# Altium schematic symbol library BARKO_SCHLIB.SchLib: 1064 symbols (part 9 of 11) (continued)
## R-1K8-0603 (continued)
RES SMD 1.8K OHM 5% 1/10W 0603; Manufacturer: Yageo; Manufacturer Part Number: RC0603JR-071K8L; Resistance: 1.8kR; Temperature Coefficient: 100ppm/°C; Voltage Rating (DC): 50V; Power Rating: 100mW; Working Voltage: 75V; .PCBCHK: USED; .Creator: F:TALI; Washability: OK; Stock 1: 1678078; Pricing 1: 1=0.1, 10=0.022, 100=0.0088, 1000=0.00396, 2500=0.00344 (USD); Number of Pins: 2; Case Code (Metric): 1608; Case Code (Imperial): 0603; Min Operating Temperature: -55°C; Max Operating Temperature: 155°C; Tolerance: 5%; Composition: Thick Film; Packaging: Tape and Reel; Package Quantity: 1; Voltage Rating: 50V; Number of Terminations: 2; Termination: SMD/SMT; Military Standard: Not; Max Power Dissipation: 100mW; Features: Moisture Resistant; Length: 1.6mm; Height: 0.022inch; Width: 0.8mm; Depth: 0.8mm; REACH SVHC: No SVHC; Lead Free: Lead Free; ComponentLink1URL: http://www.yageo.com.tw/exep/pages/download/literatures/PYu-R_INT-thick_7.pdf; ComponentLink1Description: http://www.yageo.com.tw/exep/pages/download/literatures/PYu-R_INT-thick_7.pdf; ComponentLink2URL: http://www.yageo.com/documents/recent/PYu-RC_Group_51_RoHS_L_9.pdf; ComponentLink2Description: http://www.yageo.com/documents/recent/PYu-RC_Group_51_RoHS_L_9.pdf; ComponentLink3URL: http://www.mouser.com/catalog/specsheets/RC0603.pdf; ComponentLink3Description: http://www.mouser.com/catalog/specsheets/RC0603.pdf; ComponentLink4URL: http://www.farnell.com/datasheets/443971.pdf; ComponentLink4Description: http://www.farnell.com/datasheets/443971.pdf; ComponentLink5URL: https://www.verical.com/server-webapp/html/getDatasheet?partID=327961; ComponentLink5Description: https://www.verical.com/server-webapp/html/getDatasheet?partID=327961; Stock 2: 124162; Pricing 2: 1=0.1, 10=0.016, 100=0.0064, 1000=0.00289, 2500=0.0025 (USD); Mount: Surface Mount; Contact Plating: Matte,Tin; Radiation Hardening: No; ComponentLink6URL: http://components.arrow.com/part/dataview/40961995S7458778N1174; ComponentLink6Description: http://components.arrow.com/part/dataview/40961995S7458778N1174; Stock 3: 13326; Pricing 3: 1=0.1, 10=0.034, 100=0.0138, 1000=0.00618, 2500=0.00536 (USD); Weight: 7.1E-05oz; ComponentLink7URL: http://www.mouser.com/ds/2/427/dcrcwe3-109170.pdf; ComponentLink7Description: http://www.mouser.com/ds/2/427/dcrcwe3-109170.pdf; ComponentLink8URL: http://www.vishay.com/docs/20035/dcrcwe3.pdf; ComponentLink8Description: http://www.vishay.com/docs/20035/dcrcwe3.pdf; .SCHCHK: USED; Supplier 1: Digi-Key; Supplier Part Number 1: RMCF0603JT1K80CT-ND
footprint R-0603
pins: 1, 2

## R-1K37-0402
designator R?, comment 1K37  Case Code (Imperial): 0402
RES SMD 1.37K OHM 1% 1/10W 0402; Manufacturer: Panasonic; Manufacturer Part Number: ERJ-2RKF1371X; Voltage Rating: 50V; Resistance: 1.37kR; Power Rating: 100mW; Temperature Coefficient: 100ppm/°C; .PCBCHK: USED; .Creator: F:TALI; Washability: OK; Stock 1: 237151; Pricing 1: 1=0.1, 10=0.045, 100=0.0183, 1000=0.00823, 2500=0.00715, 5000=0.0059 (USD); Mount: Surface Mount; Case/Package: 0402; Case Code (Metric): 1005; Contact Plating: Tin; Min Operating Temperature: -55°C; Max Operating Temperature: 155°C; Packaging: Tape and Reel; Tolerance: 1%; Package Quantity: 10000; Termination: SMD/SMT; Composition: Thick Film; Number of Terminations: 2; Military Standard: Not; Max Power Dissipation: 100mW; Voltage Rating (DC): 50V; Length: 1mm; Height: 0.35mm; Width: 0.5mm; Depth: 0.5mm; Radiation Hardening: No; REACH SVHC: No SVHC; Lead Free: Lead Free; ComponentLink1URL: http://www.farnell.com/datasheets/1678782.pdf; ComponentLink1Description: http://www.farnell.com/datasheets/1678782.pdf; ComponentLink2URL: https://www.alliedelec.com/m/d/623f45ff1957d936ff56d46fd1c28cac.pdf; ComponentLink2Description: https://www.alliedelec.com/m/d/623f45ff1957d936ff56d46fd1c28cac.pdf; ComponentLink3URL: http://www.farnell.com/datasheets/1911175.pdf; ComponentLink3Description: http://www.farnell.com/datasheets/1911175.pdf; Stock 2: 9960; Pricing 2: 1=0.61, 10=0.464, 100=0.1952, 1000=0.10767, 2500=0.10094 (USD); .SCHCHK: USED; Supplier 1: Digi-Key; Supplier Part Number 1: P1.37KLDKR-ND
footprint R-0402
pins: 1, 2

## R-1K-0402
designator R?, comment 1K  Case Code (Imperial): 0402
RES SMD 1K OHM 1% 1/10W 0402; Manufacturer: Vishay Beyschlag; Manufacturer Part Number: MCS04020C1001FE000; Resistance: 1kR; Temperature Coefficient: 50ppm/°C; Power Rating: 63mW; Voltage Rating: 50V; Max Power Dissipation: 100mW; .PCBCHK: USED; .Creator: F:TALI; Washability: OK; Stock 1: 159823; Pricing 1: 1=0.3, 10=0.254, 100=0.0993, 1000=0.04158, 2500=0.03812, 5000=0.03465 (USD); Mount: Surface Mount; Case/Package: 0402; Weight: 2.1E-05oz; Contact Plating: Tin; Case Code (Metric): 1005; Min Operating Temperature: -55°C; Max Operating Temperature: 125°C; Tolerance: 1%; Composition: Thin Film; Package Quantity: 1; Packaging: Tape and Reel; Number of Terminations: 2; Termination: SMD/SMT; Military Standard: Not; Voltage Rating (DC): 50V; Length: 1mm; Height: 0.015inch; Width: 0.02inch; Depth: 0.5mm; Radiation Hardening: No; REACH SVHC: No SVHC; Lead Free: Lead Free; ComponentLink1URL: http://www.vishay.com/docs/28705/mcx0x0xpro.pdf; ComponentLink1Description: http://www.vishay.com/docs/28705/mcx0x0xpro.pdf; ComponentLink2URL: http://www.vishay.com/docs/28705/mc_pro.pdf; ComponentLink2Description: http://www.vishay.com/docs/28705/mc_pro.pdf; Number of Pins: 2; Features: Automotive AEC-Q200; ComponentLink3URL: http://industrial.panasonic.com/www-data/pdf/AOA0000/AOA0000CE2.pdf; ComponentLink3Description: http://industrial.panasonic.com/www-data/pdf/AOA0000/AOA0000CE2.pdf; ComponentLink4URL: https://industrial.panasonic.com/cdbs/www-data/pdf/RDA0000/DMA0000COL11.pdf; ComponentLink4Description: https://industrial.panasonic.com/cdbs/www-data/pdf/RDA0000/DMA0000COL11.pdf; ComponentLink5URL: http://www.farnell.com/datasheets/1678782.pdf; ComponentLink5Description: http://www.farnell.com/datasheets/1678782.pdf; ComponentLink6URL: http://www.farnell.com/datasheets/1911175.pdf; ComponentLink6Description: http://www.farnell.com/datasheets/1911175.pdf; ComponentLink7URL: http://www.jameco.com/Jameco/Products/ProdDS/1987020.pdf; ComponentLink7Description: http://www.jameco.com/Jameco/Products/ProdDS/1987020.pdf; ComponentLink8URL: http://www.alliedelec.com/m/d/623f45ff1957d936ff56d46fd1c28cac.pdf; ComponentLink8Description: http://www.alliedelec.com/m/d/623f45ff1957d936ff56d46fd1c28cac.pdf; Working Voltage: 50V; ComponentLink9URL: https://industrial.panasonic.com/cdbs/www-data/pdf/RDA0000/AOA0000C301.pdf; ComponentLink9Description: https://industrial.panasonic.com/cdbs/www-data/pdf/RDA0000/AOA0000C301.pdf; ComponentLink10URL: http://www.jameco.com/Jameco/Products/ProdDS/1986781.pdf; ComponentLink10Description: http://www.jameco.com/Jameco/Products/ProdDS/1986781.pdf; ComponentLink11URL: http://www.farnell.com/datasheets/2059623.pdf; ComponentLink11Description: http://www.farnell.com/datasheets/2059623.pdf; ComponentLink12URL: http://industrial.panasonic.com/www-data/pdf/AOA0000/AOA0000CE1.pdf; ComponentLink12Description: http://industrial.panasonic.com/www-data/pdf/AOA0000/AOA0000CE1.pdf; ComponentLink13URL: http://www.alliedelec.com/m/d/51cd0790071e1666bdb9d00c57fcf960.pdf; ComponentLink13Description: http://www.alliedelec.com/m/d/51cd0790071e1666bdb9d00c57fcf960.pdf; ComponentLink14URL: http://www.farnell.com/datasheets/1500035.pdf; ComponentLink14Description: http://www.farnell.com/datasheets/1500035.pdf; Stock 2: 17028178; Pricing 2: 1=0.1, 10=0.054, 100=0.022, 1000=0.00988, 2500=0.00858, 5000=0.00709 (USD); ComponentLink15URL: https://industrial.panasonic.com/cdbs/www-data/pdf/RDA0000/AOA0000C304.pdf; ComponentLink15Description: https://industrial.panasonic.com/cdbs/www-data/pdf/RDA0000/AOA0000C304.pdf; .SCHCHK: USED; Supplier 1: Digi-Key; Supplier Part Number 1: P1.00KLDKR-ND
footprint R-0402
pins: 1, 2

## R-1K-0603
designator R?, comment 1K  Case Code (Imperial): 0603
RES SMD 1K OHM 5% 1/10W 0603; Manufacturer: Yageo; Manufacturer Part Number: RC0603JR-071KL; Resistance: 1kR; Temperature Coefficient: 100ppm/°C; Voltage Rating (DC): 50V; Power Rating: 100mW; .PCBCHK: USED; .Creator: F:TALI; Washability: OK; Supplier 1: Digi-Key; Supplier Part Number 1: 311-1.0KGRCT-ND; Stock 1: 16415399; Pricing 1: 1=0.09, 10=0.019, 100=0.0077, 1000=0.00346, 2500=0.00301 (EUR); Case/Package: 0603; Number of Pins: 2; Contact Plating: Matte,Tin; Case Code (Metric): 1608; Min Operating Temperature: -55°C; Max Operating Temperature: 155°C; Tolerance: 5%; Composition: Thick Film; Packaging: Tape and Reel; Package Quantity: 5000; Voltage Rating: 50V; Termination: SMD/SMT; Military Standard: Not; Length: 1.6mm; Height: 0.45mm; Width: 0.8mm; Depth: 0.8mm; Radiation Hardening: No; REACH SVHC: Unknown; Lead Free: Lead Free; ComponentLink1URL: http://www.yageo.com/documents/recent/PYu-RC_Group_51_RoHS_L_2.pdf; ComponentLink1Description: http://www.yageo.com/documents/recent/PYu-RC_Group_51_RoHS_L_2.pdf; ComponentLink2URL: http://www.farnell.com/datasheets/443971.pdf; ComponentLink2Description: http://www.farnell.com/datasheets/443971.pdf; Supplier 2: Digi-Key; Supplier Part Number 2: YAG1311CT-ND; Stock 2: 9; Pricing 2: 1=0.1, 10=0.044, 100=0.0178, 1000=0.00798, 2500=0.00693 (USD); Number of Terminations: 2; Max Power Dissipation: 100mW; Features: Moisture Resistant; Supplier Part Number 3: SMD0603-1K; Stock 3: 0; Pricing 3: 100=0.0125, 1000=0.0035, 5000=0.002, 15000=0.00165, 50000=0.0014 (USD); Supplier 3: Ozdisan; .SCHCHK: USED
footprint R-0603
pins: 1, 2

## R-1K-0603-0.1%
designator R?, comment 1K  Case/Package: 0603  Tolerance: 0.1%
RES SMD 1K OHM 0.1% 1/5W 0603; Manufacturer: Panasonic; Manufacturer Part Number: ERJ-PB3B1001V; Resistance: 1kR; Max Power Dissipation: 200mW; Temperature Coefficient: 50ppm/°C; Supplier 1: Digi-Key; Supplier Part Number 1: P19972CT-ND; Stock: 32907; Pricing: 1=0.23, 10=0.191, 25=0.1392, 50=0.101, 100=0.0748, 250=0.0574, 500=0.0452, 1000=0.0313 (USD); RoHS: Yes; Case Code (Metric): 1608; Case Code (Imperial): 0603; Min Operating Temperature: -55°C; Max Operating Temperature: 155°C; Packaging: Tape and Reel; Resistor Type: Thick Film; Features: Automotive AEC-Q200; Number of Terminations: 2; Length: 0.063inch; Width: 0.032inch; Height - Seated (Max): 0.022inch; ComponentLink1URL: http://www.farnell.com/datasheets/2286937.pdf?src-supplier=Newark; ComponentLink1Description: http://www.farnell.com/datasheets/2286937.pdf?src-supplier=Newark; ComponentLink2URL: https://industrial.panasonic.com/cdbs/www-data/pdf/RDM0000/DMM0000COL5.pdf?src-supplier=Digi-Key; ComponentLink2Description: https://industrial.panasonic.com/cdbs/www-data/pdf/RDM0000/DMM0000COL5.pdf?src-supplier=Digi-Key; ComponentLink3URL: https://industrial.panasonic.com/sa/system/files/data/download/catalog/id_fixed-resistors_e_2.pdf?src-supplier=Digi-Key; ComponentLink3Description: https://industrial.panasonic.com/sa/system/files/data/download/catalog/id_fixed-resistors_e_2.pdf?src-supplier=Digi-Key
footprint R-0603
pins: 1, 2

## R-1K-0805
designator R?, comment 1K  Case Code (Imperial): 0805
RES SMD 1K OHM 1% 1/8W 0805; Manufacturer: Yageo; Manufacturer Part Number: RC0805FR-071KL; Resistance: 1kR; Temperature Coefficient: 100ppm/°C; Voltage Rating (DC): 150V; Power Rating: 125mW; .PCBCHK: USED; .Creator: F:TALI; Washability: OK; Stock 1: 19295000; Pricing 1: 5000=0.00544, 10000=0.00473, 25000=0.00415, 50000=0.00381, 125000=0.00373 (USD); Case/Package: 0805; Number of Pins: 2; Case Code (Metric): 2012; Min Operating Temperature: -55°C; Max Operating Temperature: 155°C; Tolerance: 1%; Packaging: Tape and Reel; Composition: Thick Film; Package Quantity: 1; Voltage Rating: 150V; Number of Terminations: 2; Termination: SMD/SMT; Military Standard: Not; Max Power Dissipation: 125mW; Features: Moisture Resistant; Length: 0.079inch; Height: 0.024inch; Width: 0.049inch; Depth: 1.25mm; REACH SVHC: Unknown; Lead Free: Lead Free; ComponentLink1URL: http://www.yageo.com/documents/recent/PYu-RC_Group_51_RoHS_L_9.pdf; ComponentLink1Description: http://www.yageo.com/documents/recent/PYu-RC_Group_51_RoHS_L_9.pdf; ComponentLink2URL: http://documents.rs-components.com/techlib://itc_doclist_GB.htm?stockno=6183583; ComponentLink2Description: http://documents.rs-components.com/techlib://itc_doclist_GB.htm?stockno=6183583; ComponentLink3URL: http://www.farnell.com/datasheets/1686128.pdf; ComponentLink3Description: http://www.farnell.com/datasheets/1686128.pdf; ComponentLink4URL: http://www.yageo.ru/pdf/RC0805.pdf; ComponentLink4Description: http://www.yageo.ru/pdf/RC0805.pdf; ComponentLink5URL: http://www.farnell.com/datasheets/444164.pdf; ComponentLink5Description: http://www.farnell.com/datasheets/444164.pdf; Stock 2: 249237; Pricing 2: 1=0.1, 10=0.039, 100=0.0159, 1000=0.00716, 2500=0.00622 (USD); Contact Plating: Lead,Matte,Tin; Radiation Hardening: No; ComponentLink6URL: http://www.farnell.com/datasheets/2167052.pdf; ComponentLink6Description: http://www.farnell.com/datasheets/2167052.pdf; ComponentLink7URL: http://www.farnell.com/datasheets/442941.pdf; ComponentLink7Description: http://www.farnell.com/datasheets/442941.pdf; Stock 3: 229706; Pricing 3: 1=0.1, 10=0.031, 100=0.0124, 1000=0.00559, 2500=0.00485 (USD); .SCHCHK: USED; Supplier 1: Digi-Key; Supplier Part Number 1: 311-1.00KCRTR-ND
footprint R-0805
pins: 1, 2

## R-1K-1206
designator R?, comment 1K  Max Power Dissipation: 1/2W  Case Code (Imperial): 1206
RES SMD 1K 1/2W 5% 1206; Manufacturer: Stackpole Electronics; Manufacturer Part Number: RNCP1206FTD1K00; Resistance: 1kR; Tolerance: 1%; Temperature Coefficient: 100ppm/°C; .PCBCHK: USED; .Creator: F:TALI; Washability: OK; Stock 1: 605690; Pricing 1: 1=0.1, 10=0.093, 100=0.0358, 1000=0.01575, 2500=0.0136 (USD); Mount: Surface Mount; Case/Package: 1206; Case Code (Metric): 3216; Contact Plating: Matte,Tin; Min Operating Temperature: -55°C; Max Operating Temperature: 155°C; Packaging: Tape and Reel; Composition: Thin Film; Number of Terminations: 2; Features: Anti-Sulfur,Moisture Resistant; Length: 0.122inch; Height: 0.024inch; Width: 0.059inch; Radiation Hardening: No; Lead Free: Lead Free; Stock 2: 57471; Pricing 2: 1=0.16, 10=0.133, 100=0.052, 1000=0.02178, 2500=0.01996 (USD); Package Quantity: 1; ComponentLink1URL: http://www.rohm.com/web/global/datasheet/ESR01MZPF/esr-e; ComponentLink1Description: http://www.rohm.com/web/global/datasheet/ESR01MZPF/esr-e; ComponentLink2URL: https://www.rohm.com/datasheet/ESR01MZPF/esr-e; ComponentLink2Description: https://www.rohm.com/datasheet/ESR01MZPF/esr-e; Stock 3: 10000; Pricing 3: 1=0.15, 10=0.126, 100=0.0494, 1000=0.02069, 2500=0.01897 (USD); ComponentLink3URL: http://www.bourns.com/docs/Product-Datasheets/CRM0805_1206_2010.pdf; ComponentLink3Description: http://www.bourns.com/docs/Product-Datasheets/CRM0805_1206_2010.pdf; .SCHCHK: USED; Supplier 1: Digi-Key; Supplier Part Number 1: RNCP1206FTD1K00DKR-ND
footprint R-1206
pins: 1, 2

## R-1K-1206-0.1%
designator R?, comment 1K  Case/Package: 1206  Tolerance: 0.1%
RES SMD 1K OHM 0.1% 1/4W 1206; Manufacturer: Panasonic; Manufacturer Part Number: ERA8AEB102V; Resistance: 1kR; Temperature Coefficient: 25ppm/°C; Power Rating: 250mW; Voltage Rating: 150V; Supplier 1: Digi-Key; Supplier Part Number 1: P1.0KBCCT-ND; Stock: 1249; Pricing: 1=0.57, 10=0.411, 100=0.2135, 1000=0.1149, 2500=0.1117 (USD); RoHS: Yes; Mount: Surface Mount; Number of Pins: 2; Contact Plating: Tin; Case Code (Imperial): 1206; Case Code (Metric): 3216; Min Operating Temperature: -55°C; Max Operating Temperature: 155°C; Resistor Type: Metal Film,Thin Film; Packaging: Tape and Reel; Package Quantity: 5000; Number of Terminations: 2; Max Power Dissipation: 250mW; Voltage Rating (DC): 150V; Length: 3.2mm; Width: 1.6mm; Height: 0.6mm; Depth: 1.6mm; Radiation Hardening: No; REACH SVHC: No SVHC; Military Standard: Not; Lead Free: Lead Free; ComponentLink1URL: https://datasheet.ciiva.com/7942/1776116-7942422.pdf?src-supplier=Element14; ComponentLink1Description: https://datasheet.ciiva.com/7942/1776116-7942422.pdf?src-supplier=Element14; ComponentLink2URL: https://datasheet.ciiva.com/22783/1776116-22783814.pdf?src-supplier=Farnell; ComponentLink2Description: https://datasheet.ciiva.com/22783/1776116-22783814.pdf?src-supplier=Farnell; ComponentLink3URL: https://datasheet.ciiva.com/43455/1776116-43455846.pdf?src-supplier=Farnell; ComponentLink3Description: https://datasheet.ciiva.com/43455/1776116-43455846.pdf?src-supplier=Farnell; ComponentLink4URL: https://datasheet.ciiva.com/7942/1776116-7942423.pdf?src-supplier=Element14; ComponentLink4Description: https://datasheet.ciiva.com/7942/1776116-7942423.pdf?src-supplier=Element14; ComponentLink5URL: https://datasheet.ciiva.com/48425/era-eng-tds-48425687.pdf?src-supplier=Distrelec; ComponentLink5Description: https://datasheet.ciiva.com/48425/era-eng-tds-48425687.pdf?src-supplier=Distrelec; ComponentLink6URL: https://datasheet.ciiva.com/48529/era-eng-tds-48529623.pdf?src-supplier=Distrelec; ComponentLink6Description: https://datasheet.ciiva.com/48529/era-eng-tds-48529623.pdf?src-supplier=Distrelec; ComponentLink7URL: https://datasheet.ciiva.com/24022/aoa0000ce26-197354-24022680.pdf?src-supplier=Mouser; ComponentLink7Description: https://datasheet.ciiva.com/24022/aoa0000ce26-197354-24022680.pdf?src-supplier=Mouser; ComponentLink8URL: https://datasheet.ciiva.com/30107/54aoa0000ce26-30107979.pdf?src-supplier=Onlinecomponents.com; ComponentLink8Description: https://datasheet.ciiva.com/30107/54aoa0000ce26-30107979.pdf?src-supplier=Onlinecomponents.com; ComponentLink9URL: https://datasheet.ciiva.com/17215/aoa0000ce26-17215292.pdf?src-supplier=Avnet+Europe; ComponentLink9Description: https://datasheet.ciiva.com/17215/aoa0000ce26-17215292.pdf?src-supplier=Avnet+Europe; ComponentLink10URL: https://datasheet.ciiva.com/28531/1776116-28531996.pdf?src-supplier=Element14; ComponentLink10Description: https://datasheet.ciiva.com/28531/1776116-28531996.pdf?src-supplier=Element14; Termination: SMD/SMT; ComponentLink11URL: https://datasheet.ciiva.com/48425/era-eng-tds-48425576.pdf?src-supplier=Distrelec; ComponentLink11Description: https://datasheet.ciiva.com/48425/era-eng-tds-48425576.pdf?src-supplier=Distrelec; ComponentLink12URL: https://datasheet.ciiva.com/17212/aoa0000ce26-17212732.pdf?src-supplier=Avnet+Europe; ComponentLink12Description: https://datasheet.ciiva.com/17212/aoa0000ce26-17212732.pdf?src-supplier=Avnet+Europe; ComponentLink13URL: https://datasheet.ciiva.com/48529/era-eng-tds-48529628.pdf?src-supplier=Distrelec; ComponentLink13Description: https://datasheet.ciiva.com/48529/era-eng-tds-48529628.pdf?src-supplier=Distrelec; ComponentLink14URL: https://datasheet.ciiva.com/5875/391390-5875614.pdf?src-supplier=Farnell; ComponentLink14Description: https://datasheet.ciiva.com/5875/391390-5875614.pdf?src-supplier=Farnell
footprint R-1206
pins: 1, 2

## R-1K-1206_1
designator R?, comment 1K  Power Rating: 1/4W  Case Code (Imperial): 1206
RES SMD 1K OHM 5% 1/4W 1206; Manufacturer: Yageo; Manufacturer Part Number: RC1206JR-071KL; Resistance: 1kR; Voltage Rating: 200V; Max Power Dissipation: 250mW; Temperature Coefficient: 100ppm/°C; .PCBCHK: USED; .Creator: F:TALI; Washability: OK; Supplier 1: Digi-Key; Supplier Part Number 1: 311-1.0KERCT-ND; Stock 1: 3361698; Pricing 1: 1=0.1, 10=0.07, 100=0.0284, 1000=0.01274, 2500=0.01106 (USD); Case/Package: 1206; Case Code (Metric): 3216; Min Operating Temperature: -55°C; Max Operating Temperature: 155°C; Package Quantity: 1; Tolerance: 5%; Packaging: Tape and Reel; Composition: Thick Film; Number of Terminations: 2; Termination: SMD/SMT; Military Standard: Not; Length: 3.1mm; Height: 0.026inch; Width: 0.063inch; Depth: 1.6mm; REACH SVHC: Unknown; Lead Free: Lead Free; ComponentLink1URL: http://www.yageo.com/documents/recent/PYu-RC_Group_51_RoHS_L_9.pdf; ComponentLink1Description: http://www.yageo.com/documents/recent/PYu-RC_Group_51_RoHS_L_9.pdf; .SCHCHK: USED
footprint R-1206
pins: 1, 2

## R-1K-TH
designator R?, comment 1K  Mount: TH
RES 1K OHM 1/4W 5% AXIAL; Manufacturer 1: Stackpole Electronics; Manufacturer Part Number 1: CF14JT1K00; Resistance: 1kR; Power Rating: 250mW; Temperature Coefficient: -400ppm/°C; Washability: OK; .Creator: M.OZKAN; .PCBCHK: USED; Supplier 1: Digi-Key; Stock 1: 458260; Pricing 1: 1=0,10000, 10=0,04000, 25=0,02880, 50=0,02200, 100=0,01620, 250=0,01236, 500=0,00990, 1000=0,00729 (USD); RoHS: Yes; Case/Package: Conformal; Contact Plating: Tin,Matte; Min Operating Temperature: -55°C; Max Operating Temperature: 155°C; Packaging: Tape and Reel; Package Quantity: 1; Tolerance: 5%; Composition: Carbon Film; Number of Terminations: 2; Max Power Dissipation: 250mW; Features: Flame Retardant Coating; Termination: Axial; Military Standard: Not; Diameter: 2.3mm; Length: 6.5mm; Radiation Hardening: No; Lead Free: Lead Free; ComponentLink1URL: http://www.seielect.com/Catalog/SEI-CF_CFM.pdf?src-supplier=Future+Electronics; ComponentLink1Description: http://www.seielect.com/Catalog/SEI-CF_CFM.pdf?src-supplier=Future+Electronics; ComponentLink2URL: https://www.seielect.com/catalog/SEI-CF_CFM.pdf?src-supplier=Avnet; ComponentLink2Description: https://www.seielect.com/catalog/SEI-CF_CFM.pdf?src-supplier=Avnet; ComponentLink3URL: https://www.seielect.com/catalog/SEI-Packaging.pdf?src-supplier=Digi-Key; ComponentLink3Description: https://www.seielect.com/catalog/SEI-Packaging.pdf?src-supplier=Digi-Key; ComponentLink4URL: https://www.seielect.com/Catalog/SEI-CF_CFM.pdf?src-supplier=Digi-Key; ComponentLink4Description: https://www.seielect.com/Catalog/SEI-CF_CFM.pdf?src-supplier=Digi-Key; ComponentLink5URL: http://components.arrow.com/part/dataview/27620077S9848643N1174?src-supplier=Arrow; ComponentLink5Description: http://components.arrow.com/part/dataview/27620077S9848643N1174?src-supplier=Arrow; ComponentLink6URL: https://www.verical.com/server-webapp/html/getDatasheet?partID=360403&src-supplier=Verical; ComponentLink6Description: https://www.verical.com/server-webapp/html/getDatasheet?partID=360403&src-supplier=Verical; Supplier Part Number 1: CF14JT1K00CT-ND; .SCHCHK: USED
footprint R-TH
pins: 1, 2

## R-1M-0402
designator R?, comment 1M  Case Code (Imperial): 0402
RES SMD 1M OHM 1% 1/10W 0402; Manufacturer: Vishay Beyschlag; Manufacturer Part Number: MCS04020C1004FE000; Resistance: 1MR; Temperature Coefficient: 50ppm/°C; Power Rating: 63mW; Voltage Rating: 50V; Max Power Dissipation: 100mW; .PCBCHK: USED; .Creator: F:TALI; Washability: OK; Supplier 1: Digi-Key; Supplier Part Number 1: MCS0402-1.00M-CFDKR-ND; Stock 1: 2814; Pricing 1: 1=0.3, 10=0.254, 100=0.0993, 1000=0.04158, 2500=0.03812, 5000=0.03465 (USD); Mount: Surface Mount; Case/Package: 0402; Weight: 2.1E-05oz; Contact Plating: Tin; Case Code (Metric): 1005; Min Operating Temperature: -55°C; Max Operating Temperature: 125°C; Tolerance: 1%; Composition: Thin Film; Packaging: Tape and Reel; Package Quantity: 1; Number of Terminations: 2; Military Standard: Not; Voltage Rating (DC): 50V; Length: 1mm; Height: 0.015inch; Width: 0.5mm; Depth: 0.5mm; Radiation Hardening: No; REACH SVHC: No SVHC; Lead Free: Lead Free; ComponentLink1URL: http://www.mouser.com/ds/2/427/mc_pro-223600.pdf; ComponentLink1Description: http://www.mouser.com/ds/2/427/mc_pro-223600.pdf; ComponentLink2URL: http://www.vishay.com/docs/28705/mc_pro.pdf; ComponentLink2Description: http://www.vishay.com/docs/28705/mc_pro.pdf; ComponentLink3URL: http://www.vishay.com/docs/28705/mcx0x0xpro.pdf; ComponentLink3Description: http://www.vishay.com/docs/28705/mcx0x0xpro.pdf; .SCHCHK: USED
footprint R-0402
pins: 1, 2

## R-1M-0603
designator R?, comment 1M  Tolerance: 0.1%  Case Code (Imperial): 0603
RES SMD 1M OHM 0.1% 1/16W 0603; Manufacturer: TE Connectivity Neohm; Manufacturer Part Number: CPF0603B1M0E1; Resistance: 1MR; Temperature Coefficient: 25ppm/°C; Power Rating: 63mW; Voltage Rating: 50V; Number of Resistors: 1; Max Power Dissipation: 100mW; .PCBCHK: USED; .Creator: F:TALI; Washability: OK; Stock 1: 115278; Pricing 1: 1=0.44, 10=0.311, 100=0.1616 (USD); Mount: Surface Mount; Case/Package: 0603; Weight: 7.1E-05oz; Case Code (Metric): 1608; Min Operating Temperature: -55°C; Max Operating Temperature: 155°C; Packaging: Tape and Reel; Composition: Thin Film; Package Quantity: 1000; Number of Terminations: 2; Termination: Solder; Voltage Rating (DC): 50V; Length: 1.55mm; Height: 0.45mm; Width: 0.8mm; Lead Free: Lead Free; REACH SVHC: No SVHC; ELV: Compliant; ComponentLink1URL: http://www.farnell.com/datasheets/1786775.pdf; ComponentLink1Description: http://www.farnell.com/datasheets/1786775.pdf; ComponentLink2URL: http://www.farnell.com/datasheets/1723857.pdf; ComponentLink2Description: http://www.farnell.com/datasheets/1723857.pdf; ComponentLink3URL: http://www.mouser.com/ds/2/418/NG_DS_1773200_J-838467.pdf; ComponentLink3Description: http://www.mouser.com/ds/2/418/NG_DS_1773200_J-838467.pdf; Stock 2: 1931; Pricing 2: 1=0.36, 10=0.307, 100=0.12, 1000=0.05021, 2500=0.04603 (USD); Features: Moisture Resistant; Stock 3: 3196; Pricing 3: 1=0.5, 10=0.359, 100=0.1435 (USD); .SCHCHK: USED; Supplier 1: Digi-Key; Supplier Part Number 1: RNCF0603BKC1M00DKR-ND
footprint R-0603
pins: 1, 2

## R-1M-0805
designator R?, comment 1M  Case Code (Imperial): 0805
RES SMD 1M OHM 5% 1/8W 0805; Manufacturer: Yageo; Manufacturer Part Number: RC0805JR-071ML; Resistance: 1MR; Temperature Coefficient: 100ppm/°C; Power Rating: 125mW; Voltage Rating: 150V; Voltage Rating (DC): 100V; .PCBCHK: USED; .Creator: F:TALI; Washability: OK; Stock 1: 30892; Pricing 1: 100=0.03482, 1000=0.01429, 5000=0.00635, 15000=0.00531, 50000=0.00449 (USD); Case/Package: 0805; Case Code (Metric): 2012; Contact Plating: Lead,Matte,Tin; Min Operating Temperature: -55°C; Max Operating Temperature: 155°C; Tolerance: 5%; Composition: Thick Film; Packaging: Tape and Reel; Package Quantity: 1; Termination: SMD/SMT; Number of Terminations: 2; Military Standard: Not; Max Power Dissipation: 125mW; Features: Moisture Resistant; Length: 0.079inch; Height: 0.024inch; Width: 0.049inch; Depth: 1.25mm; Radiation Hardening: No; REACH SVHC: Unknown; Lead Free: Lead Free; ComponentLink1URL: http://www.yageo.com/documents/recent/PYu-RC_Group_51_RoHS_L_9.pdf; ComponentLink1Description: http://www.yageo.com/documents/recent/PYu-RC_Group_51_RoHS_L_9.pdf; ComponentLink2URL: http://www.yageo.ru/pdf/RC0805.pdf; ComponentLink2Description: http://www.yageo.ru/pdf/RC0805.pdf; ComponentLink3URL: http://www.farnell.com/datasheets/442941.pdf; ComponentLink3Description: http://www.farnell.com/datasheets/442941.pdf; ComponentLink4URL: http://www.farnell.com/datasheets/444164.pdf; ComponentLink4Description: http://www.farnell.com/datasheets/444164.pdf; Stock 2: 100758; Pricing 2: 1=0.1, 10=0.019, 100=0.0079, 1000=0.00353, 2500=0.00306 (USD); Mount: Surface Mount; Number of Pins: 2; Thickness: 508um; ComponentLink5URL: https://www.bourns.com/docs/Product-Datasheets/CHPREZTR.pdf; ComponentLink5Description: https://www.bourns.com/docs/Product-Datasheets/CHPREZTR.pdf; ComponentLink6URL: http://www.mouser.com/ds/2/54/chpreztr-977002.pdf; ComponentLink6Description: http://www.mouser.com/ds/2/54/chpreztr-977002.pdf; ComponentLink7URL: http://www.farnell.com/datasheets/1791942.pdf; ComponentLink7Description: http://www.farnell.com/datasheets/1791942.pdf; ComponentLink8URL: http://www.bourns.com/pdfs/chpreztr.pdf; ComponentLink8Description: http://www.bourns.com/pdfs/chpreztr.pdf; ComponentLink9URL: http://www.farnell.com/datasheets/1968067.pdf; ComponentLink9Description: http://www.farnell.com/datasheets/1968067.pdf; Stock 3: 20000; Pricing 3: 10000=0.0029, 30000=0.00255, 50000=0.00234, 100000=0.00232 (USD); ComponentLink10URL: https://www.verical.com/server-webapp/html/getDatasheet?partID=739908; ComponentLink10Description: https://www.verical.com/server-webapp/html/getDatasheet?partID=739908; .SCHCHK: USED; Supplier 1: Digi-Key; Supplier Part Number 1: RMCF0805FG1M00TR-ND
footprint R-0805
pins: 1, 2

## R-1R3-2512
designator R?, comment 1R3  Max Power Dissipation: 1W  Case Code (Imperial): 2512
RES SMD 1.3 OHM 5% 1W 2512; Manufacturer: Rohm; Manufacturer Part Number: MCR100JZHJ1R3; Resistance: 1.3R; Voltage Rating (DC): 200V; Temperature Coefficient: 100ppm/°C; .PCBCHK: USED; .Creator: F:TALI; Washability: OK; Stock 1: 7103; Pricing 1: 1=0.28, 10=0.24, 100=0.0937, 1000=0.0392 (USD); Tolerance: 5%; Power Rating: 1W; Stock 2: 14570; Pricing 2: 1=0.64, 10=0.536, 25=0.46, 50=0.4138, 100=0.3602, 250=0.32188, 500=0.26056, 1000=0.21074 (USD); Mount: Surface Mount; Case/Package: 2512; Number of Pins: 2; Contact Plating: Tin; Case Code (Metric): 6432; Min Operating Temperature: -55°C; Max Operating Temperature: 125°C; Composition: Low-Ohm-Resistor,Thick Film; Packaging: Tape and Reel; Package Quantity: 1; Number of Terminations: 2; Termination: SMD/SMT; Military Standard: Not; Features: Automotive AEC-Q200; Length: 6.4mm; Height: 0.6mm; Width: 0.126inch; Depth: 3.2mm; Radiation Hardening: No; REACH SVHC: No SVHC; ComponentLink1URL: http://uk.rs-online.com/webdocs/13b8/0900766b813b869e.pdf; ComponentLink1Description: http://uk.rs-online.com/webdocs/13b8/0900766b813b869e.pdf; ComponentLink2URL: https://www.distrelec.biz/Web/Downloads/_t/ds/ERJ_eng_tds.pdf?mime=application%2Fpdf; ComponentLink2Description: https://www.distrelec.biz/Web/Downloads/_t/ds/ERJ_eng_tds.pdf?mime=application%2Fpdf; ComponentLink3URL: http://industrial.panasonic.com/www-data/pdf/AOA0000/AOA0000CE3.pdf; ComponentLink3Description: http://industrial.panasonic.com/www-data/pdf/AOA0000/AOA0000CE3.pdf; ComponentLink4URL: http://www.farnell.com/datasheets/652411.pdf; ComponentLink4Description: http://www.farnell.com/datasheets/652411.pdf; ComponentLink5URL: http://www.mouser.com/ds/2/315/AOA0000C295-1109214.pdf; ComponentLink5Description: http://www.mouser.com/ds/2/315/AOA0000C295-1109214.pdf; Stock 3: 11875; Pricing 3: 1=0.72, 10=0.511, 100=0.2659, 1000=0.14319 (USD); .SCHCHK: USED; Supplier 1: Digi-Key; Supplier Part Number 1: RHM1.3BCDKR-ND
footprint R-2512
pins: 1, 2

## R-1R-0805
designator R?, comment 1R  Max Power Dissipation: 1/4W  Case Code (Imperial): 0805
RES SMD 1 OHM 1/4W 1% 0805; Manufacturer: Stackpole Electronics; Manufacturer Part Number: RNCP0805FTD1R00; Temperature Coefficient: 100ppm/°C; .PCBCHK: USED; .Creator: F:TALI; Washability: OK; ComponentLink1URL: https://www.verical.com/server-webapp/html/getDatasheet?partID=493439; ComponentLink1Description: https://www.verical.com/server-webapp/html/getDatasheet?partID=493439; ComponentLink2URL: http://uk.rs-online.com/webdocs/0fcd/0900766b80fcdb72.pdf; ComponentLink2Description: http://uk.rs-online.com/webdocs/0fcd/0900766b80fcdb72.pdf; ComponentLink3URL: http://www.bourns.com/data/global/pdfs/CHPREZTR.pdf; ComponentLink3Description: http://www.bourns.com/data/global/pdfs/CHPREZTR.pdf; ComponentLink4URL: http://www.bourns.com/pdfs/chpreztr.pdf; ComponentLink4Description: http://www.bourns.com/pdfs/chpreztr.pdf; ComponentLink5URL: http://www.farnell.com/datasheets/1968067.pdf; ComponentLink5Description: http://www.farnell.com/datasheets/1968067.pdf; ComponentLink6URL: http://riedon.com/media/pdf/PCR.pdf; ComponentLink6Description: http://riedon.com/media/pdf/PCR.pdf; ComponentLink7URL: https://riedon.com/media/pdf-tech/riedon_brochure_download.pdf; ComponentLink7Description: https://riedon.com/media/pdf-tech/riedon_brochure_download.pdf; Mount: Surface Mount; Case/Package: 0805; Case Code (Metric): 2012; Contact Plating: Matte,Tin; Min Operating Temperature: -55°C; Max Operating Temperature: 155°C; Resistance: 1R; Tolerance: 1%; Packaging: Tape and Reel; Composition: Thin Film; Number of Terminations: 2; Features: Anti-Sulfur,Moisture Resistant; Length: 0.079inch; Height: 0.024inch; Width: 0.049inch; Radiation Hardening: No; Lead Free: Lead Free; Stock 1: 44136; Pricing 1: 1=0.1, 10=0.072, 100=0.0277, 1000=0.0122, 2500=0.01053 (USD); Stock 2: 9279; Pricing 2: 1=0.3, 10=0.254, 25=0.1848, 50=0.134, 100=0.0993, 250=0.07624, 500=0.06006 (USD); Stock 3: 13730; Pricing 3: 1=0.36, 10=0.306, 100=0.1197, 1000=0.05009, 2500=0.04592 (USD); Package Quantity: 1; .SCHCHK: USED; Supplier 1: Digi-Key; Supplier Part Number 1: RNCP0805FTD1R00CT-ND
footprint R-0805
pins: 1, 2

## R-1R-0805_1
designator R?, comment 1R  Case Code (Imperial): 0805
RES SMD 1 OHM 1/8W 5% 0805; Manufacturer: Stackpole Electronics; Manufacturer Part Number: RMCF0805JT1R00; Power Rating: 125mW; Temperature Coefficient: 200ppm/°C; .PCBCHK: USED; .Creator: F:TALI; Washability: OK; Supplier 1: Digi-Key; Supplier Part Number 1: RMCF0805JT1R00DKR-ND; Stock 1: 50714; Pricing 1: 1=0.1, 10=0.021, 100=0.0086, 1000=0.00385, 2500=0.00334 (USD); Mount: Surface Mount; Case/Package: 0805; Case Code (Metric): 2012; Contact Plating: Matte,Tin; Min Operating Temperature: -55°C; Max Operating Temperature: 155°C; Tolerance: 5%; Packaging: Tape and Reel; Resistance: 1R; Composition: Thick Film; Number of Terminations: 2; Military Standard: Not; Max Power Dissipation: 125mW; Features: Automotive AEC-Q200; Length: 0.079inch; Height: 0.026inch; Width: 0.049inch; Depth: 1.25mm; Radiation Hardening: No; Lead Free: Lead Free; ComponentLink1URL: https://www.verical.com/server-webapp/html/getDatasheet?partID=493439; ComponentLink1Description: https://www.verical.com/server-webapp/html/getDatasheet?partID=493439; .SCHCHK: USED
footprint R-0805
pins: 1, 2

## R-1R-1206
designator R?, comment 1R  Max Power Dissipation: 1/4W  Case Code (Imperial): 1206
RES SMD 1 OHM 5% 1/4W 1206; Manufacturer: Yageo; Manufacturer Part Number: RC1206JR-071RL; Temperature Coefficient: 200ppm/°C; Power Rating: 250mW; Voltage Rating: 200V; .PCBCHK: USED; .Creator: F:TALI; Washability: OK; Stock 1: 1943; Pricing 1: 1=0.14, 10=0.125, 100=0.0482, 1000=0.02123, 2500=0.01833 (USD); Case/Package: 1206; Contact Plating: Matte,Tin; Case Code (Metric): 3216; Min Operating Temperature: -55°C; Max Operating Temperature: 155°C; Resistance: 1R; Tolerance: 5%; Composition: Thick Film; Packaging: Tape and Reel; Package Quantity: 5000; Number of Terminations: 2; Termination: SMD/SMT; Military Standard: Not; Voltage Rating (DC): 200V; Length: 0.122inch; Height: 0.026inch; Width: 0.063inch; Depth: 1.6mm; Radiation Hardening: No; REACH SVHC: No SVHC; Lead Free: Lead Free; ComponentLink1URL: http://www.yageo.com/documents/recent/PYu-RC_Group_51_RoHS_L_9.pdf; ComponentLink1Description: http://www.yageo.com/documents/recent/PYu-RC_Group_51_RoHS_L_9.pdf; ComponentLink2URL: http://www.yageo.com/documents/recent/PYu-RC1206_51_RoHS_L-4.pdf; ComponentLink2Description: http://www.yageo.com/documents/recent/PYu-RC1206_51_RoHS_L-4.pdf; Mount: Surface Mount; Features: Anti-Sulfur,Moisture Resistant; ComponentLink3URL: http://www1.futureelectronics.com/doc/SAMSUNG/RCSERIES.pdf; ComponentLink3Description: http://www1.futureelectronics.com/doc/SAMSUNG/RCSERIES.pdf; ComponentLink4URL: http://www.produktinfo.conrad.com/datenblaetter/425000-449999/434453-da-01-en-SMD_WIDERST_1206_RC_3216_1R00_1__0_250W.pdf; ComponentLink4Description: http://www.produktinfo.conrad.com/datenblaetter/425000-449999/434453-da-01-en-SMD_WIDERST_1206_RC_3216_1R00_1__0_250W.pdf; ComponentLink5URL: http://www.produktinfo.conrad.com/datenblaetter/450000-474999/459449-da-01-en-WIDERSTAND_1206.pdf; ComponentLink5Description: http://www.produktinfo.conrad.com/datenblaetter/450000-474999/459449-da-01-en-WIDERSTAND_1206.pdf; Stock 2: 55000; Pricing 2: 5000=0.02095, 10000=0.01955, 25000=0.01857, 50000=0.0182, 125000=0.01781 (USD); Number of Pins: 2; ComponentLink6URL: https://www.bourns.com/docs/Product-Datasheets/CRM0805_1206_2010.pdf; ComponentLink6Description: https://www.bourns.com/docs/Product-Datasheets/CRM0805_1206_2010.pdf; ComponentLink7URL: http://www.farnell.com/datasheets/1936783.pdf; ComponentLink7Description: http://www.farnell.com/datasheets/1936783.pdf; ComponentLink8URL: http://www.bourns.com/data/global/pdfs/CRM0805_1206_2010.pdf; ComponentLink8Description: http://www.bourns.com/data/global/pdfs/CRM0805_1206_2010.pdf; Stock 3: 68307; Pricing 3: 1=0.15, 10=0.127, 100=0.0497, 1000=0.02079, 2500=0.01906 (USD); ComponentLink9URL: http://www1.futureelectronics.com/doc/ROHM%20SEMICONDUCTOR/ESR10EZPD.pdf; ComponentLink9Description: http://www1.futureelectronics.com/doc/ROHM%20SEMICONDUCTOR/ESR10EZPD.pdf; ComponentLink10URL: http://www.rohm.com/web/global/datasheet/ESR01MZPF/esr-e; ComponentLink10Description: http://www.rohm.com/web/global/datasheet/ESR01MZPF/esr-e; ComponentLink11URL: https://www.rohm.com/datasheet/ESR01MZPF/esr-e; ComponentLink11Description: https://www.rohm.com/datasheet/ESR01MZPF/esr-e; ComponentLink12URL: http://datasheet.octopart.com/ESR18EZPF1R00-Rohm-datasheet-12510428.pdf; ComponentLink12Description: http://datasheet.octopart.com/ESR18EZPF1R00-Rohm-datasheet-12510428.pdf; ComponentLink13URL: http://datasheet.octopart.com/ESR18EZPF1R00-Rohm-datasheet-12521351.pdf; ComponentLink13Description: http://datasheet.octopart.com/ESR18EZPF1R00-Rohm-datasheet-12521351.pdf; ComponentLink14URL: http://datasheet.octopart.com/ESR18EZPF1R00-Rohm-datasheet-13205105.pdf; ComponentLink14Description: http://datasheet.octopart.com/ESR18EZPF1R00-Rohm-datasheet-13205105.pdf; ComponentLink15URL: http://datasheet.octopart.com/ESR18EZPF1R00-Rohm-datasheet-79607656.pdf; ComponentLink15Description: http://datasheet.octopart.com/ESR18EZPF1R00-Rohm-datasheet-79607656.pdf; ComponentLink16URL: http://datasheet.octopart.com/ESR18EZPF1R00-Rohm-datasheet-112214108.pdf; ComponentLink16Description: http://datasheet.octopart.com/ESR18EZPF1R00-Rohm-datasheet-112214108.pdf; ComponentLink17URL: http://datasheet.octopart.com/ESR18EZPF1R00-Rohm-datasheet-103686705.pdf; ComponentLink17Description: http://datasheet.octopart.com/ESR18EZPF1R00-Rohm-datasheet-103686705.pdf; .SCHCHK: USED; Supplier 1: Digi-Key; Supplier Part Number 1: 311-1.0ERDKR-ND
footprint R-1206
pins: 1, 2

## R-1R-1206_1
designator R?, comment 1R  Max Power Dissipation: 1/2W  Case Code (Imperial): 1206